# Altium footprint library XU-GENARAL PCB .PcbLib: 1176 footprints (part 23 of 75)
Each footprint in its own frame and in the unit in brackets; x right, y up, seen from the top. Pads: shape width x height; smd on the part's side, far side on the other; paste and mask are expansions set on the pad; w line width, h text height; cw(c..) or ccw(c..) is an arc to the next point about the centre after c.
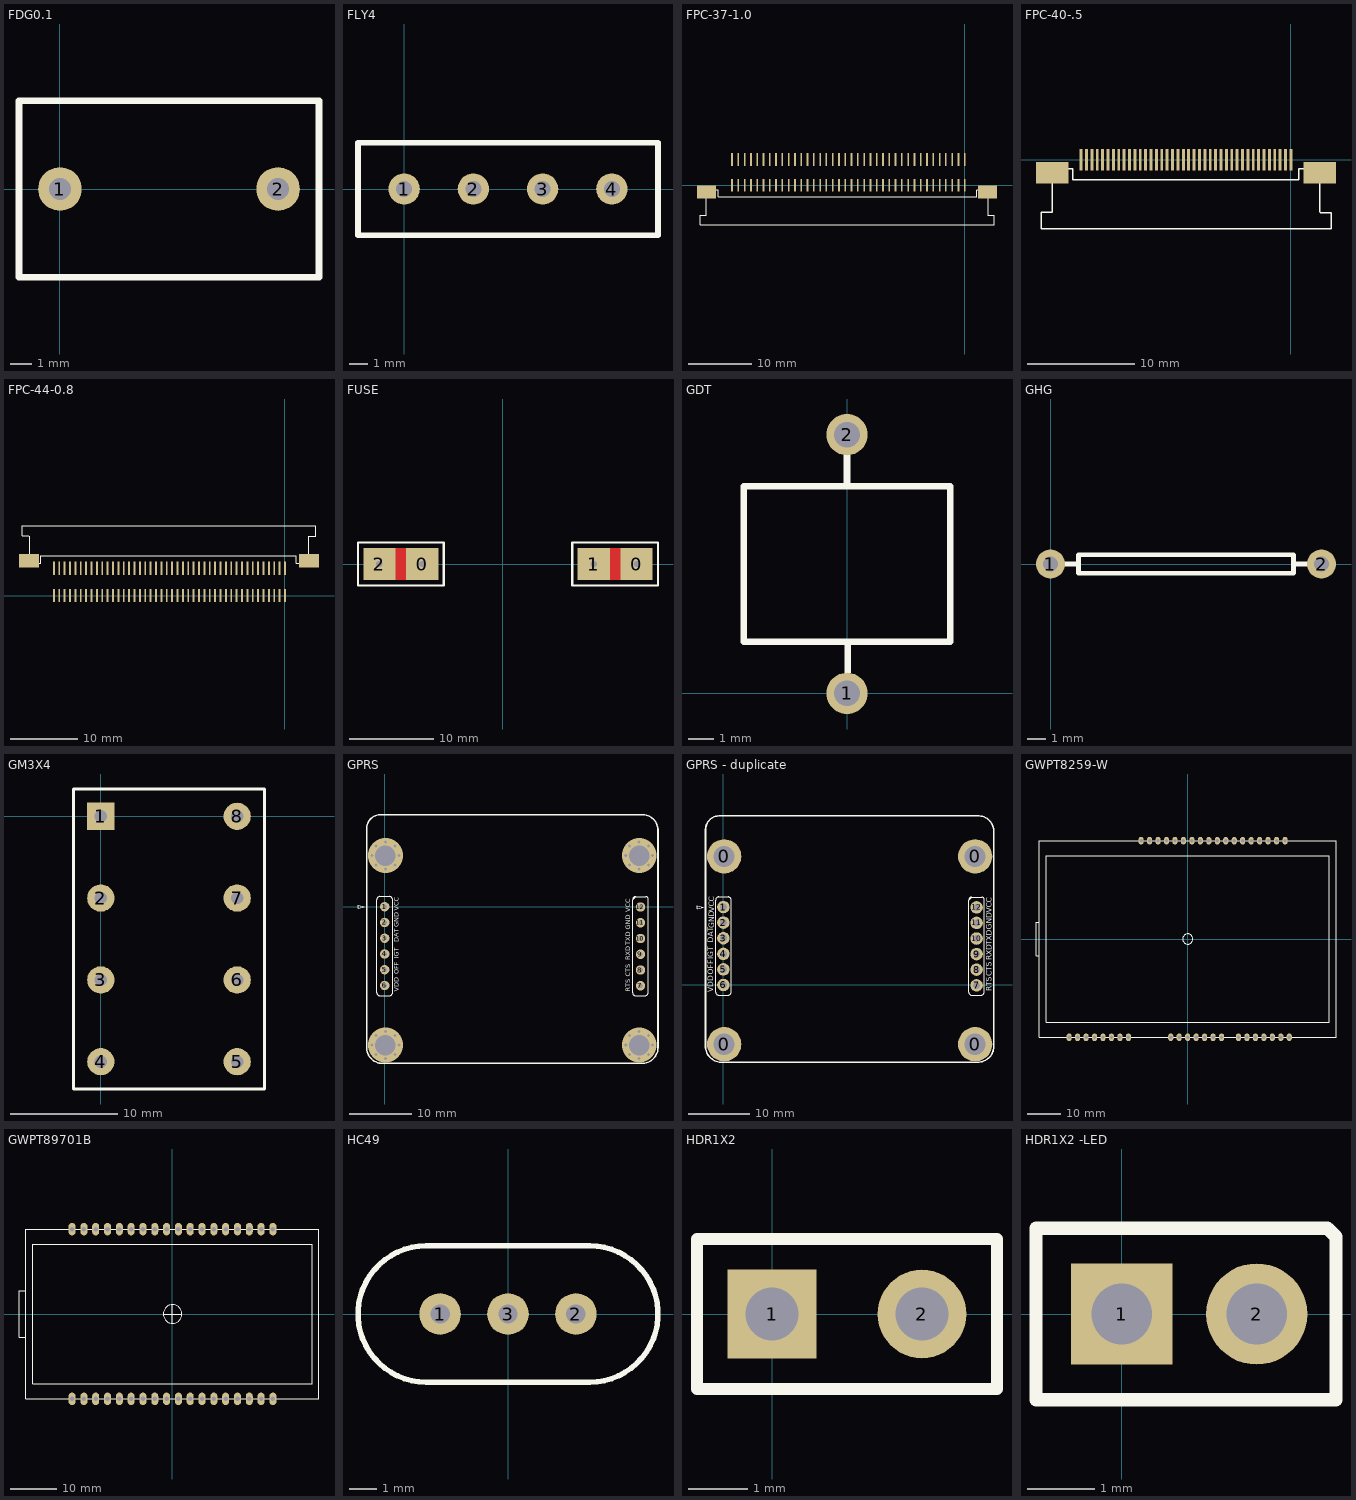
[diagram p22: the footprints below, top view; thin cyan lines are the x and y axes]

## FDG0.1 [mil]
pads (2):
  round 80 hole 40: 1(0,0) 2(400,0)
Top Overlay:
  lines w12: -75,-162 -75,162 475,162 475,-162 ; -75,-161.42 475,-161.42

## FLY4 [mil]
pads (4):
  round 68 hole 35: 1(0,0) 2(150,0) 3(300,0) 4(450,0)
Top Overlay:
  lines w12: -100,-100 -100,100 550,100 550,-100 -100,-100

## FPC-37-1.0 [mm]
pads (78):
  rect 0.27x2 smd: 1(0,0) 1(0,4.064) 2(-1,0) 2(-1,4.064) 3(-2,0) 3(-2,4.064) 4(-3,0) 4(-3,4.064) 5(-4,0) 5(-4,4.064) 6(-5,0) 6(-5,4.064) 7(-6,0) 7(-6,4.064) 8(-7,0) 8(-7,4.064) 9(-8,0) 9(-8,4.064) 10(-9,0) 10(-9,4.064) 11(-10,0) 11(-10,4.064) 12(-11,0) 12(-11,4.064) 13(-12,0) 13(-12,4.064) 14(-13,0) 14(-13,4.064) 15(-14,0) 15(-14,4.064) 16(-15,0) 16(-15,4.064) 17(-16,0) 17(-16,4.064) 18(-17,0) 18(-17,4.064) 19(-18,0) 19(-18,4.064) 20(-19,0) 20(-19,4.064) 21(-20,0) 21(-20,4.064) 22(-21,0) 22(-21,4.064) 23(-22,0) 23(-22,4.064) 24(-23,0) 24(-23,4.064) 25(-25,0) 25(-25,4.064) 26(-26,0) 26(-26,4.064) 26(-24,0) 26(-24,4.064) 27(-27,0) 27(-27,4.064) 28(-28,0) 28(-28,4.064) 29(-29,0) 29(-29,4.064) 30(-30,0) 30(-30,4.064) 31(-31,0) 31(-31,4.064) 32(-32,0) 32(-32,4.064) 33(-33,0) 33(-33,4.064) 34(-34,0) 34(-34,4.064) 35(-35,0) 35(-35,4.064) 36(-36,0) 36(-36,4.064) 37(-37,0) 37(-37,4.064)
  rect 3x2 smd: ""(-41.072,-1.1) ""(3.624,-1.1)
Top Overlay:
  lines w0.127: 1.893,-0.788 1.893,-1.889 -39.196,-1.889 -39.196,-0.729 -41.067,-0.729 -41.067,-4.793 -42.083,-4.793 -42.083,-6.317 4.666,-6.317 ; 1.893,-0.729 3.624,-0.729 3.624,-4.793 ; 3.65,-4.818 4.666,-4.818 4.666,-6.317 ; 4.666,-6.317 4.666,-6.317

## FPC-40-.5 [mm]
pads (42):
  rect 0.27x2 smd: 1(0,0) 2(-0.5,0) 3(-1,0) 4(-1.5,0) 5(-2,0) 6(-2.5,0) 7(-3,0) 8(-3.5,0) 9(-4,0) 10(-4.5,0) 11(-5,0) 12(-5.5,0) 13(-6,0) 14(-6.5,0) 15(-7,0) 16(-7.5,0) 17(-8,0) 18(-8.5,0) 19(-9,0) 20(-9.5,0) 21(-10,0) 22(-10.5,0) 23(-11,0) 24(-11.5,0) 25(-12,0) 26(-12.5,0) 27(-13,0) 28(-13.5,0) 29(-14,0) 30(-14.5,0) 31(-15,0) 32(-15.5,0) 33(-16,0) 34(-16.5,0) 35(-17,0) 36(-17.5,0) 37(-18,0) 38(-18.5,0) 39(-19,0) 40(-19.5,0)
  rect 3x2 smd: ""(-22.192,-1.184) ""(2.692,-1.184)
Top Overlay:
  lines w0.127: -22.708,-6.401 3.734,-6.401 ; -19.202,-6.401 -22.162,-6.401 -23.203,-6.401 -23.203,-4.877 -22.187,-4.877 -22.187,-0.813 -20.257,-0.813 -20.257,-1.829 -19.761,-1.829 0.737,-1.829 0.737,-0.813 2.692,-0.813 2.692,-4.877 ; 2.718,-4.902 3.734,-4.902 3.734,-6.401 ; 3.734,-6.401 3.734,-6.401

## FPC-44-0.8 [mm]
pads (90):
  rect 0.27x2 smd: 1(0,0) 1(0,4.064) 2(-0.8,0) 2(-0.8,4.064) 3(-1.6,0) 3(-1.6,4.064) 4(-2.4,0) 4(-2.4,4.064) 5(-3.2,0) 5(-3.2,4.064) 6(-4,0) 6(-4,4.064) 7(-4.8,0) 7(-4.8,4.064) 8(-5.6,0) 8(-5.6,4.064) 9(-6.4,0) 9(-6.4,4.064) 10(-7.2,0) 10(-7.2,4.064) 11(-8,0) 11(-8,4.064) 12(-8.8,0) 12(-8.8,4.064) 13(-9.6,0) 13(-9.6,4.064) 14(-10.4,0) 14(-10.4,4.064) 15(-11.2,0) 15(-11.2,4.064) 16(-12,0) 16(-12,4.064) 17(-12.8,0) 17(-12.8,4.064) 18(-13.6,0) 18(-13.6,4.064) 19(-14.4,0) 19(-14.4,4.064) 20(-15.2,0) 20(-15.2,4.064) 21(-16,0) 21(-16,4.064) 22(-16.8,0) 22(-16.8,4.064) 23(-17.6,0) 23(-17.6,4.064) 24(-18.4,0) 24(-18.4,4.064) 25(-19.2,0) 25(-19.2,4.064) 26(-20,0) 26(-20,4.064) 27(-20.8,0) 27(-20.8,4.064) 28(-21.6,0) 28(-21.6,4.064) 29(-22.4,0) 29(-22.4,4.064) 30(-23.2,0) 30(-23.2,4.064) 31(-24,0) 31(-24,4.064) 32(-24.8,0) 32(-24.8,4.064) 33(-25.6,0) 33(-25.6,4.064) 34(-26.4,0) 34(-26.4,4.064) 35(-27.2,0) 35(-27.2,4.064) 36(-28,0) 36(-28,4.064) 37(-28.8,0) 37(-28.8,4.064) 38(-29.6,0) 38(-29.6,4.064) 39(-30.4,0) 39(-30.4,4.064) 40(-31.2,0) 40(-31.2,4.064) 41(-32,0) 41(-32,4.064) 42(-32.8,0) 42(-32.8,4.064) 43(-33.6,0) 43(-33.6,4.064) 44(-34.4,0) 44(-34.4,4.064)
  rect 3x2 smd: ""(-38.088,5.164) ""(3.561,5.164)
Top Overlay:
  lines w0.127: -38.113,8.882 -39.129,8.882 -39.129,10.381 ; -38.088,8.857 -38.088,4.793 -36.356,4.793 ; -36.356,4.852 -36.356,5.953 1.685,5.953 1.685,4.793 3.556,4.793 3.556,8.857 4.572,8.857 4.572,10.381 -39.129,10.381 ; -39.129,10.381 -39.129,10.381

## FUSE [mil]
pads (4):
  rect 150x150 hole 30: 0(-375,0) 0(625,0) 1(425,0) 2(-575,0)
Top Layer:
  rectangle: -525,-75 -425,75
  rectangle: 475,-75 575,75
Bottom Layer:
  rectangle: -525,-75 -425,75
  rectangle: 475,-75 575,75
Top Overlay:
  lines w10: -675,-100 -275,-100 -275,100 -675,100 -675,-100 ; 325,-100 725,-100 725,100 325,100 325,-100

## GDT [mm]
pads (2):
  round 1.6 hole 1: 1(0,0) 2(0,10)
Top Overlay:
  lines w0.254: 0,9.22 0,8 ; 0.025,0.838 0.025,1.975 ; 0,8 4,8 4,2 0,2 -4,2 -4,8 0,8

## GHG [mil]
pads (2):
  round 62 hole 32: 1(-1,0) 2(579,0)
Top Overlay:
  lines w10: -1,0 59,0 ; 519,0 579,0 ; 59,-20 519,-20 519,20 59,20 59,-20

## GM3X4 [mil]
pads (8):
  rect 100x100 hole 45: 1(0,0)
  round 100 hole 45: 2(0,-300) 3(0,-600) 4(0,-900) 5(500,-900) 6(500,-600) 7(500,-300) 8(500,0)
Top Overlay:
  lines w12: -100,-1000 600,-1000 600,100 -100,100 -100,-1000

## GPRS [mil]
pads (12):
  round 60 hole 30: 1(0,0) 2(0,-100) 3(0,-200) 4(0,-300) 5(0,-400) 6(0,-500) 7(1624,-501.87) 8(1624,-401.87) 9(1624,-301.87) 10(1624,-201.87) 11(1624,-101.87) 12(1624,-1.87)
via 5,325 diameter 220 hole 130
via 65.45,385.45 diameter 20 hole 20
via 65,265 diameter 20 hole 20
via 90,325 diameter 20 hole 20
via -55,385 diameter 20 hole 20
via -56.03,263.97 diameter 20 hole 20
via -80,325 diameter 20 hole 20
via 5,240 diameter 20 hole 20
via 5,410 diameter 20 hole 20
via 1615,410 diameter 20 hole 20
via 1615,240 diameter 20 hole 20
via 1530,325 diameter 20 hole 20
via 1553.97,263.97 diameter 20 hole 20
via 1555,385 diameter 20 hole 20
via 1700,325 diameter 20 hole 20
via 1675,265 diameter 20 hole 20
via 1675.45,385.45 diameter 20 hole 20
via 1615,-793 diameter 20 hole 20
via 1615,-963 diameter 20 hole 20
via 1530,-878 diameter 20 hole 20
via 1553.97,-939.03 diameter 20 hole 20
via 1555,-818 diameter 20 hole 20
via 1700,-878 diameter 20 hole 20
via 1675,-938 diameter 20 hole 20
via 1675.45,-817.55 diameter 20 hole 20
via 5,-793 diameter 20 hole 20
via 90,-878 diameter 20 hole 20
via 5,-963 diameter 20 hole 20
via -56.03,-939.03 diameter 20 hole 20
via 65,-938 diameter 20 hole 20
via 65.45,-817.55 diameter 20 hole 20
via -55,-818 diameter 20 hole 20
via -80,-878 diameter 20 hole 20
via 1615,325 diameter 220 hole 130
via 5,-878 diameter 220 hole 130
via 1615,-878 diameter 220 hole 130
Top Overlay:
  lines w0: 1574,44 1593.13,63.13
  lines w5: -169.37,-9.84 -130,0 -169.37,9.84 -169.37,-9.84
  lines w7.87: 1655.95,64 1594,64 ccw(c1594,44) 1574,44 1574,-545.72 ccw(c1593.99,-545.72) 1593.99,-565.71 1649.1,-565.71 ccw(c1649.1,-540.81) 1674,-540.81 1674,46 ccw(c1655.95,46) 1655.95,64.05 ; -50,-545 ccw(c-30,-545) -30,-565 30,-565 ccw(c30,-545) 50,-545 50,45 ccw(c30,45) 30,65 -30,65 ccw(c-30,45) -50,45 -50,-545
  lines w10: -115,-890 ccw(c-12.5,-892.5) -15,-995 1630,-995 ccw(c1632.5,-892.5) 1735,-895 1735,490 ccw(c1635,485) 1630,585 -19.85,585 ccw(c-24.93,494.93) -115,500 -115,-890
  text "VDD" at 90,-540 h30
  text "OFF" at 90,-430 h30
  text "IGT" at 90,-330 h30
  text "VCC" at 90,-25 h30
  text "CTS" at 1560,-445 h30
  text "RXD" at 1560,-340 h30
  text "TXD" at 1560,-245 h30
  text "GND" at 1560,-145 h30
  text "VCC" at 1560,-35 h30
  text "RTS" at 1560,-540 h30
  text "GND" at 90,-130 h30
  text "DAT" at 90,-225 h30

## GPRS - duplicate [mil]
height 267.72
pads (16):
  round 220 hole 135: 0(5,-380) 0(5,825) 0(1615,-380) 0(1615,825)
  round 80 hole 45: 1(0,500) 2(0,400) 3(0,300) 4(0,200) 5(0,100) 6(0,0) 7(1624,-1.87) 8(1624,98.13) 9(1624,198.13) 10(1624,298.13) 11(1624,398.13) 12(1624,498.13)
Top Overlay:
  lines w0: 1574,544 1593.13,563.13
  lines w5: -169.37,490.16 -169.37,509.84 -130,500 -169.37,490.16
  lines w7.87: 1655.95,564 1594,564 ccw(c1594,544) 1574,544 1574,-45.72 ccw(c1593.99,-45.72) 1593.99,-65.71 1649.1,-65.71 ccw(c1649.1,-40.81) 1674,-40.81 1674,546 ccw(c1655.95,546) 1655.95,564.05 ; -50,-45 ccw(c-30,-45) -30,-65 30,-65 ccw(c30,-45) 50,-45 50,545 ccw(c30,545) 30,565 -30,565 ccw(c-30,545) -50,545 -50,-45
  lines w10: -115,-390 ccw(c-12.5,-392.5) -15,-495 1630,-495 ccw(c1632.5,-392.5) 1735,-395 1735,990 ccw(c1635,985) 1630,1085 -19.85,1085 ccw(c-24.93,994.93) -115,1000 -115,-390
  text "DAT" at -65,270 h35
  text "GND" at -60,365 h35
  text "RTS" at 1720,-40 h35
  text "VCC" at 1720,465 h35
  text "GND" at 1720,355 h35
  text "TXD" at 1720,255 h35
  text "RXD" at 1720,160 h35
  text "CTS" at 1720,55 h35
  text "VCC" at -60,470 h35
  text "IGT" at -65,165 h35
  text "OFF" at -65,65 h35
  text "VDD" at -65,-45 h35

## GWPT8259-W [mil]
pads (41):
  oval 60x90 hole 40: 1(-550,1161.42) 2(-450,1161.42) 3(-350,1161.42) 4(-250,1161.42) 5(-150,1161.42) 6(-50,1161.42) 7(50,1161.42) 8(150,1161.42) 9(250,1161.42) 10(350,1161.42) 11(450,1161.42) 12(550,1161.42) 13(650,1161.42) 14(750,1161.42) 15(850,1161.42) 16(950,1161.42) 17(1050,1161.42) 18(1150,1161.42) 19(-1400,-1161.42) 20(-1300,-1161.42) 21(-1200,-1161.42) 22(-1100,-1161.42) 23(-1000,-1161.42) 24(-900,-1161.42) 25(-800,-1161.42) 26(-700,-1161.42) 27(-200,-1161.42) 28(-100,-1161.42) 29(0,-1161.42) 30(100,-1161.42) 31(200,-1161.42) 32(300,-1161.42) 33(400,-1161.42) 34(600,-1161.42) 34(600,-1161.42) 35(700,-1161.42) 36(800,-1161.42) 37(900,-1161.42) 38(1000,-1161.42) 39(1100,-1161.42) 40(1200,-1161.42)
Top Overlay:
  circle w5: c0,0 r60
  lines w5: -1751.97,-196.85 -1791.34,-196.85 -1791.34,196.85 -1751.97,196.85 ; -1751.97,-1161.42 1751.97,-1161.42 1751.97,1161.42 -1751.97,1161.42 -1751.97,-1161.42 ; -1673.23,-984.25 1673.23,-984.25 1673.23,984.25 -1673.23,984.25 -1673.23,-984.25

## GWPT89701B [mm]
pads (36):
  oval 1.5x2.7 hole 1: 1(-21.59,-18.25) 2(-19.05,-18.25) 3(-16.51,-18.25) 4(-13.97,-18.25) 5(-11.43,-18.25) 6(-8.89,-18.25) 7(-6.35,-18.25) 8(-3.81,-18.25) 9(-1.27,-18.25) 10(1.27,-18.25) 11(3.81,-18.25) 12(6.35,-18.25) 13(8.89,-18.25) 14(11.43,-18.25) 15(13.97,-18.25) 16(16.51,-18.25) 17(19.05,-18.25) 18(21.59,-18.25) 19(21.59,18.25) 20(19.05,18.25) 21(16.51,18.25) 22(13.97,18.25) 23(11.43,18.25) 24(8.89,18.25) 25(6.35,18.25) 26(3.81,18.25) 27(1.27,18.25) 28(-1.27,18.25) 29(-3.81,18.25) 30(-6.35,18.25) 31(-8.89,18.25) 32(-11.43,18.25) 33(-13.97,18.25) 34(-16.51,18.25) 35(-19.05,18.25) 36(-21.59,18.25)
Top Overlay:
  circle w0.127: c0,0 r2
  lines w0.127: -31.5,-5 -33,-5 -33,5 -31.5,5 ; -2,0 2,0 ; 0,-2 0,2 ; -31.5,-18.25 -31.5,18.25 31.5,18.25 31.5,-18.25 -31.5,-18.25 ; -30,-15 -30,15 30,15 30,-15 -30,-15

## HC49 [mil]
pads (3):
  round 60 hole 28: 1(-98.03,0) 2(98.03,0) 3(0,0)
Top Overlay:
  lines w7.87: -118.03,-98.42 cw(c-118.03,0) -118.03,98.42 118.03,98.42 cw(c118.03,0) 118.03,-98.42 -118.03,-98.42

## HDR1X2 [mm] "Connector; Header; 2 Position"
height 1.75
pads (2):
  rect 1.5x1.5 hole 0.9: 1(0,0)
  round 1.5 hole 0.9: 2(2.54,0)
Top Overlay:
  lines w0.2: -1.27,-1.27 3.81,-1.27 3.81,1.27 -1.27,1.27 -1.27,-1.27

## HDR1X2 -LED [mm] "Connector; Header; 2 Position"
height 1.75
pads (2):
  rect 1.5x1.5 hole 0.9: 1(0,0)
  round 1.5 hole 0.9: 2(2,0)
Top Overlay:
  lines w0.2: -1.27,-1.27 -1.27,1.27 3.048,1.27 3.175,1.143 3.175,-1.27 -1.27,-1.27